# Altium footprint library Item_pcb.PcbLib: 282 footprints (part 15 of 18)
Each footprint in its own frame and in the unit in brackets; x right, y up, seen from the top. Pads: shape width x height; smd on the part's side, far side on the other; paste and mask are expansions set on the pad; w line width, h text height; cw(c..) or ccw(c..) is an arc to the next point about the centre after c.
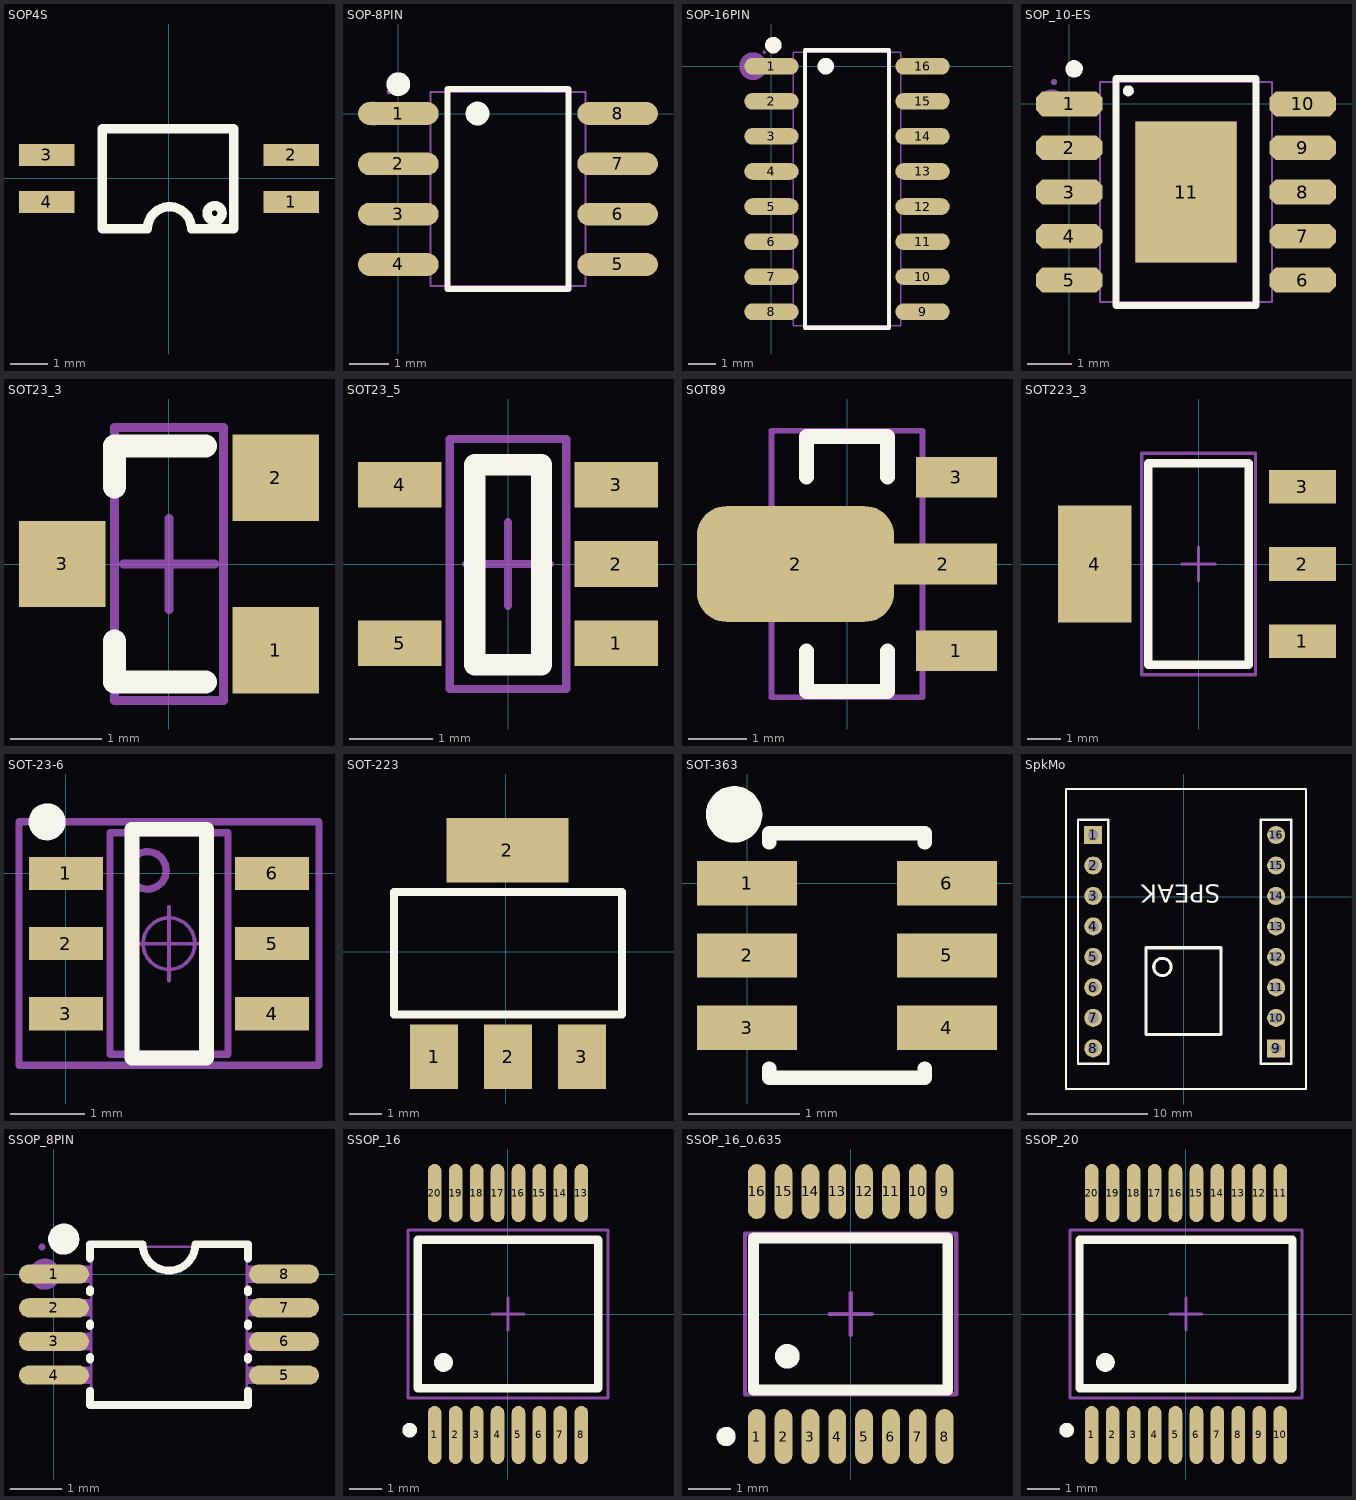
[diagram p14: the footprints below, top view; thin cyan lines are the x and y axes]

## SOP4S [mm]
pads (4):
  rect 1.5x0.6 smd: 1(3.31,-0.635) 2(3.31,0.635) 3(-3.309,0.635) 4(-3.309,-0.635)
Top Overlay:
  circle w0.254: c1.235,-0.94 r0.203
  lines w0.254: -1.805,-1.361 -1.805,1.346 ; -1.794,-1.361 -0.582,-1.361 cw(c0.013,-1.361) 0.608,-1.361 1.751,-1.361 1.751,1.346 -1.786,1.346
3D body "SOP-4-1.step": height 2.1, standoff 0, extent -3.492,-1.397 3.507,1.403

## SOP-8PIN [mm]
pads (8):
  oval 2.036x0.574 smd: 1(0,0) 2(0,-1.27) 3(0,-2.54) 4(0,-3.81) 5(5.536,-3.81) 6(5.536,-2.54) 7(5.536,-1.27) 8(5.536,0)
Top Overlay:
  circle w0.3: c0,0.739 r0.15
  circle w0.3: c1.999,0 r0.15
  lines w0.152: 1.246,-4.431 1.246,0.621 4.289,0.621 4.289,-4.431 1.246,-4.431
Mechanical 6:
  circle w0.3: c-0.63,0 r0.15
Mechanical 15:
  region: 4.94,-3.605 4.708,-3.605 4.708,-4.015 4.94,-4.015
  region: 5.765,-3.605 4.93,-3.605 4.93,-4.015 5.765,-4.015
  region: 4.94,-2.335 4.708,-2.335 4.708,-2.745 4.94,-2.745
  region: 5.765,-2.335 4.93,-2.335 4.93,-2.745 5.765,-2.745
  region: 4.94,-1.065 4.708,-1.065 4.708,-1.475 4.94,-1.475
  region: 5.765,-1.065 4.93,-1.065 4.93,-1.475 5.765,-1.475
  region: 4.94,0.205 4.708,0.205 4.708,-0.205 4.94,-0.205
  region: 5.765,0.205 4.93,0.205 4.93,-0.205 5.765,-0.205
  region: 0.595,-3.605 0.828,-3.605 0.828,-4.015 0.595,-4.015
  region: -0.23,-3.605 0.605,-3.605 0.605,-4.015 -0.23,-4.015
  region: 0.595,-2.335 0.828,-2.335 0.828,-2.745 0.595,-2.745
  region: -0.23,-2.335 0.605,-2.335 0.605,-2.745 -0.23,-2.745
  region: 0.595,-1.065 0.828,-1.065 0.828,-1.475 0.595,-1.475
  region: -0.23,-1.065 0.605,-1.065 0.605,-1.475 -0.23,-1.475
  region: 0.595,0.205 0.828,0.205 0.828,-0.205 0.595,-0.205
  region: -0.23,0.205 0.605,0.205 0.605,-0.205 -0.23,-0.205
  region: -0.23,0.485 -0.205,0.485 -0.17,0.52 -0.17,0.57 -0.205,0.605 -0.23,0.605 -0.255,0.605 -0.29,0.57 -0.29,0.52 -0.255,0.485
  lines w0.051: 0.818,-4.355 0.818,0.545 4.718,0.545 4.718,-4.355 0.818,-4.355
3D body "SOIC8.STEP": height 1.75, standoff 0, extent -0.254,-4.405 5.758,0.595

## SOP-16PIN [mm]
pads (16):
  oval 1.971x0.602 smd: 1(0,0) 2(0,-1.27) 3(0,-2.54) 4(0,-3.81) 5(0,-5.08) 6(0,-6.35) 7(0,-7.62) 8(0,-8.89) 9(5.471,-8.89) 10(5.471,-7.62) 11(5.471,-6.35) 12(5.471,-5.08) 13(5.471,-3.81) 14(5.471,-2.54) 15(5.471,-1.27) 16(5.471,0)
Top Overlay:
  circle w0.3: c1.966,0 r0.15
  circle w0.3: c0.069,0.762 r0.15
  lines w0.152: 1.214,-9.471 4.257,-9.471 4.257,0.581 1.214,0.581 1.214,-9.471
Mechanical 6:
  circle w0.5: c-0.664,0 r0.25
Mechanical 15:
  drawing of 37 lines, arcs and shapes, not listed
3D body "ESOP16.STEP": height 1.53, standoff -0.03, extent -0.254,-9.445 5.752,0.555

## SOP_10-ES [mil]
pads (11):
  oct 59.6x22 smd mask+2: 1(0,0) 2(0,-39.3) 3(0,-78.7) 4(0,-118.1) 5(0,-157.4) 6(208.6,-157.4) 7(208.6,-118.1) 8(208.6,-78.7) 9(208.6,-39.3) 10(208.6,0)
  rect 90.6x126 smd mask+2: 11(104.3,-78.7)
Top Overlay:
  lines w4.9: 50.21,11.57 50.3,12.48 ; 50.46,10.69 51.02,9.95 ; 50.7,13.31 51.38,13.93 ; 51.8,9.47 52.7,9.3 53.6,9.47 ; 52.24,14.26 53.16,14.26 ; 54.02,13.93 54.7,13.31 ; 54.38,9.95 54.94,10.69 ; 55.1,12.48 55.19,11.57
  lines w6: 41.8,-180.1 41.8,22.7 166.8,22.7 166.8,-180.1 41.8,-180.1
  lines w7.9: 0.41,31.06 0.47,32.03 ; 0.59,30.09 1.01,29.21 ; 0.77,32.96 1.29,33.79 ; 1.63,28.46 2.42,27.88 ; 2.01,34.46 2.86,34.93 ; 3.33,27.52 4.3,27.4 5.27,27.52 ; 3.81,35.17 4.79,35.17 ; 5.74,34.93 6.59,34.46 ; 6.18,27.88 6.97,28.46 ; 7.3,33.79 7.83,32.96 ; 7.59,29.21 8.01,30.09 ; 8.13,32.03 8.19,31.06
Mechanical 6:
  lines w11.8: -21.6,1.54 -21.48,2.48 ; -21.56,0.59 -21.37,-0.34 ; -21.22,3.39 -20.81,4.25 ; -21.03,-1.23 -20.56,-2.05 ; -20.27,5.03 -19.61,5.72 ; -19.96,-2.79 -19.24,-3.42 ; -18.85,6.29 -18.01,6.73 ; -18.44,-3.92 -17.57,-4.3 ; -17.11,7.03 -16.17,7.18 ; -16.65,-4.52 -15.7,-4.6 -14.75,-4.52 ; -15.23,7.18 -14.29,7.03 ; -13.83,-4.3 -12.96,-3.92 ; -13.39,6.73 -12.55,6.29 ; -12.16,-3.42 -11.44,-2.79 ; -11.79,5.72 -11.13,5.03 ; -10.84,-2.05 -10.37,-1.23 ; -10.59,4.25 -10.18,3.39 ; -10.03,-0.34 -9.84,0.59 ; -9.92,2.48 -9.8,1.54
Mechanical 15:
  drawing of 26 lines, arcs and shapes, not listed
3D body "esson.STEP": height 74.8, standoff 3.94, extent -13.8,-177.13 222.4,19.7

## SOT23_3 [mm]
pads (3):
  rect 0.95x0.95 smd: 1(1.175,-0.95) 2(1.175,0.95) 3(-1.175,0)
Top Overlay:
  lines w0.254: -0.6,-0.85 -0.6,-1.3 0.4,-1.3 ; -0.6,0.85 -0.6,1.3 0.4,1.3
Mechanical 15:
  lines w0.1: -0.5,0 0.5,0 ; 0,-0.5 0,0.5 ; -0.6,-1.5 -0.6,1.5 0.6,1.5 0.6,-1.5 -0.6,-1.5
3D body "SOT23.STEP": height 1.08, standoff 0, extent -1.34,-1.5 1.3,1.5

## SOT23_5 [mm]
pads (5):
  rect 1x0.55 smd: 1(1.3,-0.95) 2(1.3,0) 3(1.3,0.95) 4(-1.3,0.95) 5(-1.3,-0.95)
Top Overlay:
  lines w0.254: -0.4,-1.21 0.4,-1.21 0.4,1.19 -0.4,1.19 -0.4,-1.21
Mechanical 15:
  lines w0.1: -0.5,0 0.5,0 ; 0,-0.5 0,0.5 ; -0.7,-1.5 -0.7,1.5 0.7,1.5 0.7,-1.5 -0.7,-1.5
3D body "SOT23-5R.STEP": height 1.3, standoff 0, extent -1.516,-1.51 1.484,1.49

## SOT89 [mm]
pads (4):
  rect 1.4x0.7 smd: 1(1.887,-1.5) 3(1.887,1.5)
  rrect50% 3.4x2 smd: 2(-0.888,0)
  rect 1.85x0.7 smd: 2(1.662,0)
Top Overlay:
  lines w0.254: -0.7,-1.5 -0.7,-2.2 0.7,-2.2 0.7,-1.5 ; -0.7,1.5 -0.7,2.2 0.7,2.2 0.7,1.5
Mechanical 15:
  lines w0.1: -1.3,-2.3 -1.3,2.3 1.3,2.3 1.3,-2.3 -1.3,-2.3
3D body "SOT89.STEP": height 1.62, standoff 0.01, extent -2.077,-2.317 2.173,2.283

## SOT223_3 [mm]
pads (4):
  rect 2x1 smd: 1(3.1,-2.3) 2(3.1,0) 3(3.1,2.3)
  rect 2.2x3.5 smd: 4(-3.1,0)
Top Overlay:
  lines w0.254: -1.5,-3 -1.5,3 1.5,3 1.5,-3 -1.5,-3
Mechanical 15:
  lines w0.1: -0.5,0 0.5,0 ; 0,-0.5 0,0.5 ; -1.7,-3.3 1.7,-3.3 1.7,3.3 -1.7,3.3 -1.7,-3.3
3D body "SOT223.STEP": height 1.64, standoff -0.01, extent -3.5,-3.25 3.5,3.25

## SOT-23-6 [mm]
pads (6):
  rect 1x0.45 smd: 1(0,0) 2(0,-0.95) 3(0,-1.9) 4(2.794,-1.9) 5(2.794,-0.95) 6(2.794,0)
Top Overlay:
  circle w0.25: c-0.254,0.7 r0.125
  lines w0.2: 0.897,-2.5 1.905,-2.5 1.905,0.6 0.897,0.6 0.897,-2.5
Mechanical 13:
  circle w0.1: c1.105,0.042 r0.254
  lines w0.1: 0.597,-2.45 0.597,0.55 2.197,0.55 2.197,-2.45 0.597,-2.45
Mechanical 15:
  circle w0.05: c1.397,-0.95 r0.35
  lines w0.05: 0.897,-0.95 1.897,-0.95 ; 1.397,-1.45 1.397,-0.45
  lines w0.1: -0.635,-2.6 -0.635,0.7 3.429,0.7 3.429,-2.6 -0.635,-2.6
3D body "SOT23-6.STEP": height 1.15, standoff -0.03, extent -0.007,-2.45 2.8,0.55

## SOT-223 [mil]
pads (4):
  rect 59x79 smd: 1(-88,-129) 2(2.55,-129) 3(93.1,-129)
  rect 150x79 smd: 2(1.88,124.54)
Top Overlay:
  lines w10: -137.45,-77 142.55,-77 142.55,73 -137.45,73 -137.45,-77
3D body "SOT-223_MP04A.STEP": height 66.93, standoff 0, extent -126.41,-137.72 129.5,136.3

## SOT-363 [mm] "ina199"
pads (6):
  rect 0.9x0.4 smd: 1(0,0) 2(0,-0.65) 3(0,-1.3) 4(1.8,-1.3) 5(1.8,-0.65) 6(1.8,0)
Top Overlay:
  circle w0.254: c-0.116,0.62 r0.127
  lines w0.127: 0.2,-1.668 0.2,-1.75 1.6,-1.75 1.6,-1.668 ; 0.2,0.368 0.2,0.45 1.6,0.45 1.6,0.368
3D body "User Library-SOT-23-6.STEP": height 1.08, standoff -0.01, extent -0.368,-2.032 2.057,0.762

## SpkMo [mm]
pads (16):
  rect 1.5x1.5 hole 0.9: 1(-7.544,5.131) 9(7.696,-12.649)
  round 1.5 hole 0.9: 2(-7.544,2.591) 3(-7.544,0.051) 4(-7.544,-2.489) 5(-7.544,-5.029) 6(-7.544,-7.569) 7(-7.544,-10.109) 8(-7.544,-12.649) 10(7.696,-10.109) 11(7.696,-7.569) 12(7.696,-5.029) 13(7.696,-2.489) 14(7.696,0.051) 15(7.696,2.591) 16(7.696,5.131)
Top Overlay:
  circle w0.254: c-1.778,-5.867 r0.723
  lines w0.2: -9.811,-16.038 10.189,-16.038 10.189,8.962 -9.811,8.962 -9.811,-16.038 ; -8.814,-13.919 -8.814,6.401 -6.274,6.401 -6.274,-13.919 -8.814,-13.919 ; 6.426,-13.919 8.966,-13.919 8.966,6.401 6.426,6.401 6.426,-13.919
  lines w0.254: -3.161,-11.506 -3.161,-4.267 3.124,-4.267 3.124,-11.506 -3.161,-11.506
  text "SPEAK" at 3.052,1.5 h2.54
3D body "HEADER 2.54X8.stp": height -3.1, standoff -14.3, extent 6.447,-13.919 8.945,6.401
3D body "HEADER 2.54X8.stp": height -3.1, standoff -14.3, extent -8.793,-13.919 -6.295,6.401
3D body "ESOP8.STEP": height 13.53, standoff 11.99, extent -3.275,-11.393 2.73,-6.393
3D body: height 12, standoff 11, extent -9.804,-16.002 10.262,8.966
3D body "USB micro_D.STEP": height 14.79, standoff 11.05, extent -4.083,2.882 3.888,9.582

## SSOP_8PIN [mm]
pads (8):
  oval 1.35x0.37 smd: 1(0,0) 2(0,-0.65) 3(0,-1.3) 4(0,-1.95) 5(4.44,-1.95) 6(4.44,-1.3) 7(4.44,-0.65) 8(4.44,0)
Top Overlay:
  circle w0.3: c0.188,0.676 r0.15
  lines w0.152: 0.696,-2.251 0.696,-2.527 3.744,-2.527 3.744,-2.251 ; 0.696,-1.649 0.696,-1.601 ; 0.696,-0.999 0.696,-0.951 ; 0.696,-0.349 0.696,-0.301 ; 0.696,0.301 0.696,0.577 1.712,0.577 ccw(c2.22,0.577) 2.728,0.577 3.744,0.577 3.744,0.301 ; 3.744,-1.649 3.744,-1.601 ; 3.744,-0.999 3.744,-0.951 ; 3.744,-0.349 3.744,-0.301
Mechanical 6:
  circle w0.3: c-0.18,0 r0.15
Mechanical 15:
  region: -0.23,-1.785 0.32,-1.785 0.32,-2.115 -0.23,-2.115
  region: 0.31,-1.785 0.73,-1.785 0.73,-2.115 0.31,-2.115
  region: 4.12,-1.785 4.67,-1.785 4.67,-2.115 4.12,-2.115
  region: 3.71,-1.785 4.13,-1.785 4.13,-2.115 3.71,-2.115
  region: -0.23,0.165 0.32,0.165 0.32,-0.165 -0.23,-0.165
  region: 0.31,0.165 0.73,0.165 0.73,-0.165 0.31,-0.165
  region: -0.23,-0.485 0.32,-0.485 0.32,-0.815 -0.23,-0.815
  region: 0.31,-0.485 0.73,-0.485 0.73,-0.815 0.31,-0.815
  region: -0.23,-1.135 0.32,-1.135 0.32,-1.465 -0.23,-1.465
  region: 0.31,-1.135 0.73,-1.135 0.73,-1.465 0.31,-1.465
  region: 4.12,0.165 4.67,0.165 4.67,-0.165 4.12,-0.165
  region: 3.71,0.165 4.13,0.165 4.13,-0.165 3.71,-0.165
  region: 4.12,-0.485 4.67,-0.485 4.67,-0.815 4.12,-0.815
  region: 3.71,-0.485 4.13,-0.485 4.13,-0.815 3.71,-0.815
  region: 4.12,-1.135 4.67,-1.135 4.67,-1.465 4.12,-1.465
  region: 3.71,-1.135 4.13,-1.135 4.13,-1.465 3.71,-1.465
  region: -0.23,0.465 -0.205,0.465 -0.17,0.5 -0.17,0.55 -0.205,0.585 -0.23,0.585 -0.255,0.585 -0.29,0.55 -0.29,0.5 -0.255,0.465
  lines w0.051: 0.72,-2.475 0.72,0.525 3.72,0.525 3.72,-2.475 0.72,-2.475

## SSOP_16 [mm] "0.65"
pads (16):
  oval 0.42x1.8 smd: 1(-2.275,-3.75) 2(-1.625,-3.75) 3(-0.975,-3.75) 4(-0.325,-3.75) 5(0.325,-3.75) 6(0.975,-3.75) 7(1.625,-3.75) 8(2.275,-3.75) 13(2.275,3.75) 14(1.625,3.75) 15(0.975,3.75) 16(0.325,3.75) 17(-0.325,3.75) 18(-0.975,3.75) 19(-1.625,3.75) 20(-2.275,3.75)
Top Overlay:
  circle w0.3: c-2,-1.5 r0.141
  circle w0.254: c-3.05,-3.6 r0.1
  lines w0.254: -2.8,-2.3 2.8,-2.3 2.8,2.3 -2.8,2.3 -2.8,-2.3
Mechanical 15:
  lines w0.1: -0.5,0 0.5,0 ; 0,-0.5 0,0.5 ; -3.1,-2.6 -3.1,2.6 3.1,2.6 3.1,-2.6 -3.1,-2.6
3D body "SSOP-16.STEP": height 1.9, standoff 0, extent -3.1,-3.9 3.1,3.9

## SSOP_16_0.635 [mm]
pads (16):
  oval 0.42x1.3 smd: 1(-2.222,-2.9) 2(-1.587,-2.9) 3(-0.953,-2.9) 4(-0.318,-2.9) 5(0.318,-2.9) 6(0.953,-2.9) 7(1.587,-2.9) 8(2.222,-2.9) 9(2.222,2.9) 10(1.587,2.9) 11(0.953,2.9) 12(0.318,2.9) 13(-0.318,2.9) 14(-0.953,2.9) 15(-1.587,2.9) 16(-2.222,2.9)
Top Overlay:
  circle w0.254: c-2.947,-2.9 r0.1
  circle w0.3: c-1.5,-1 r0.141
  lines w0.254: -2.3,-1.8 2.3,-1.8 2.3,1.8 -2.3,1.8 -2.3,-1.8
Mechanical 15:
  lines w0.1: -0.5,0 0.5,0 ; 0,-0.5 0,0.5 ; -2.5,-1.9 2.5,-1.9 2.5,1.9 -2.5,1.9 -2.5,-1.9
3D body "SSOP-16-0.635.STEP": height 1.1, standoff 0, extent -2.512,-3 2.467,2.994

## SSOP_20 [mm] "0.65"
pads (20):
  oval 0.42x1.8 smd: 1(-2.925,-3.75) 2(-2.275,-3.75) 3(-1.625,-3.75) 4(-0.975,-3.75) 5(-0.325,-3.75) 6(0.325,-3.75) 7(0.975,-3.75) 8(1.625,-3.75) 9(2.275,-3.75) 10(2.925,-3.75) 11(2.925,3.75) 12(2.275,3.75) 13(1.625,3.75) 14(0.975,3.75) 15(0.325,3.75) 16(-0.325,3.75) 17(-0.975,3.75) 18(-1.625,3.75) 19(-2.275,3.75) 20(-2.925,3.75)
Top Overlay:
  circle w0.254: c-3.7,-3.6 r0.1
  circle w0.3: c-2.5,-1.5 r0.141
  lines w0.254: -3.3,-2.3 3.3,-2.3 3.3,2.3 -3.3,2.3 -3.3,-2.3
Mechanical 15:
  lines w0.1: -0.5,0 0.5,0 ; 0,-0.5 0,0.5 ; -3.6,-2.6 -3.6,2.6 3.6,2.6 3.6,-2.6 -3.6,-2.6
3D body "SSOP-20.STEP": height 1.9, standoff 0, extent -3.6,-3.9 3.6,3.9